# Altium footprint library klp.PcbLib: 436 footprints (part 12 of 28)
Each footprint in its own frame and in the unit in brackets; x right, y up, seen from the top. Pads: shape width x height; smd on the part's side, far side on the other; paste and mask are expansions set on the pad; w line width, h text height; cw(c..) or ccw(c..) is an arc to the next point about the centre after c.
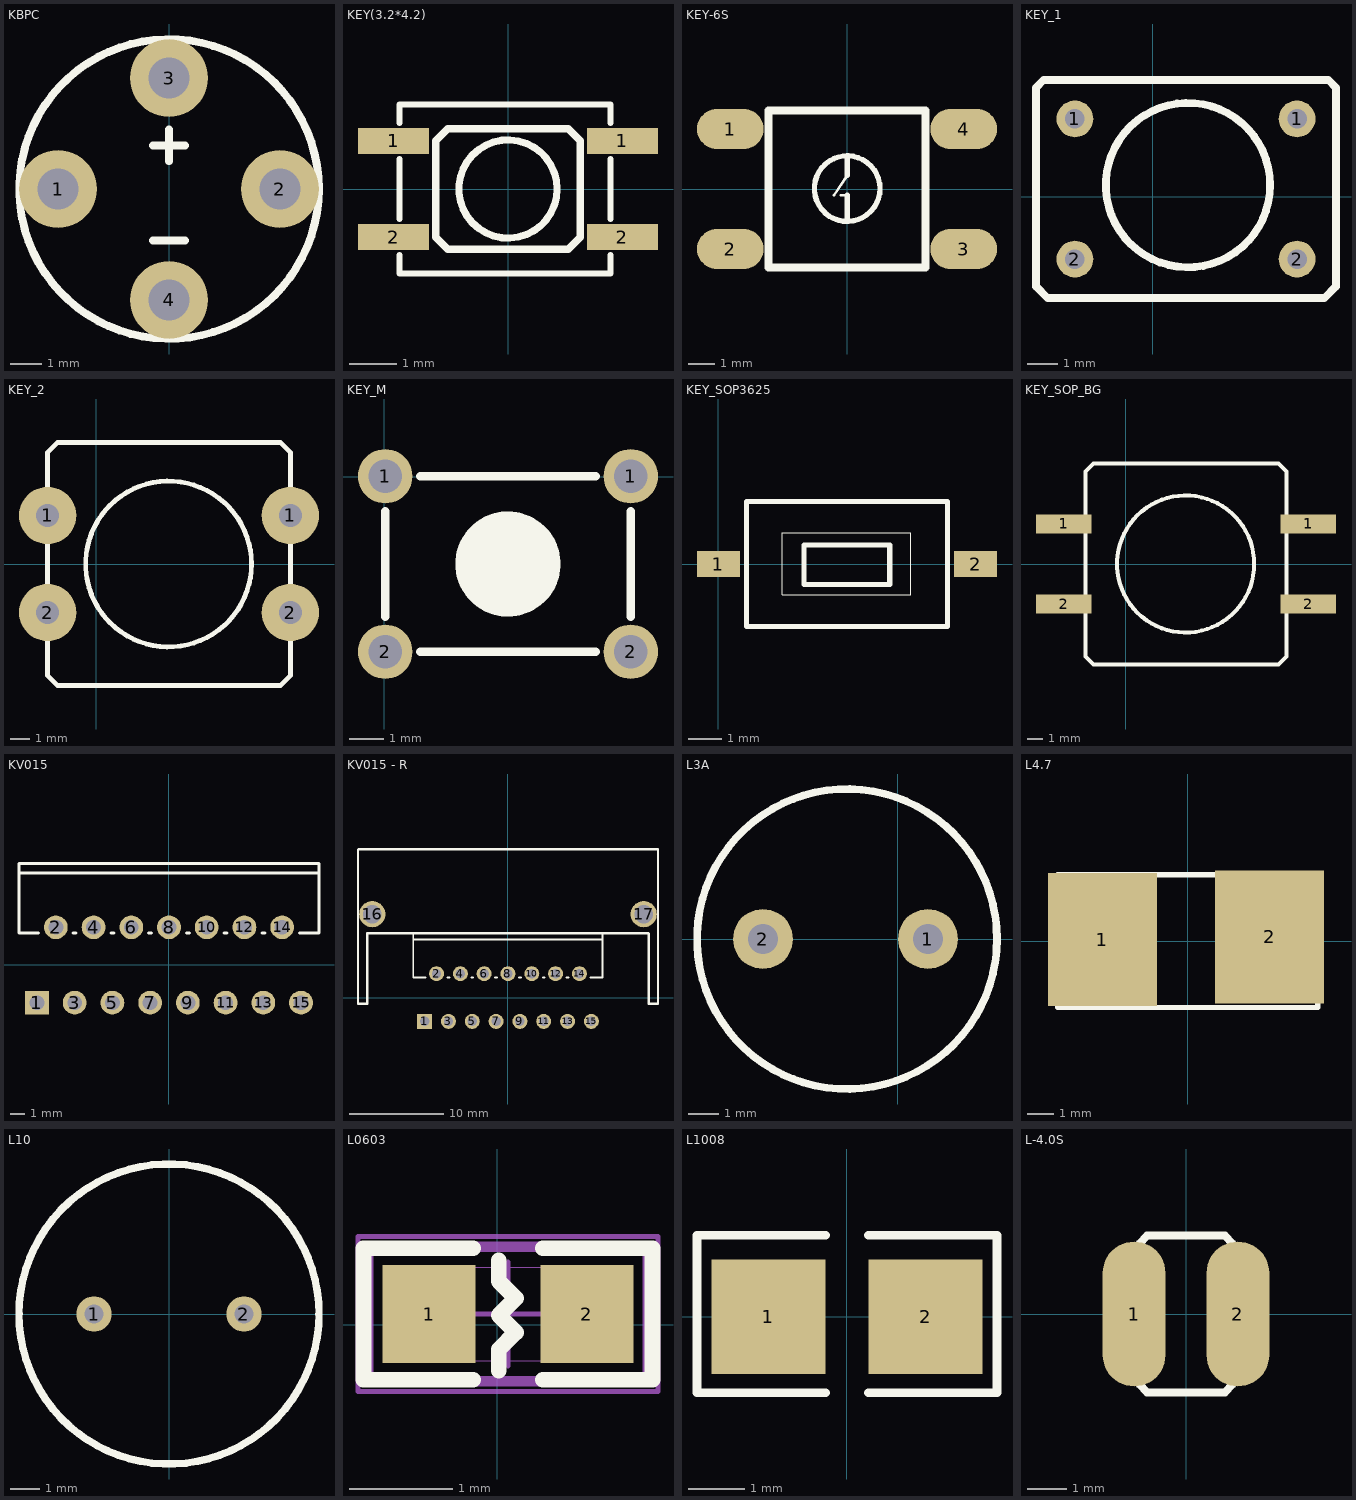
[diagram p11: the footprints below, top view; thin cyan lines are the x and y axes]

## KBPC [mm] "2W10"
height 5
pads (4):
  round 2.5 hole 1.3: 1(-3.556,12.7) 2(3.556,12.7) 3(0,16.256) 4(0,9.144)
Top Overlay:
  circle w0.254: c0,12.7 r4.8
  lines w0.254: -0.508,11.049 0.508,11.049 ; -0.508,14.097 0,14.097 0.508,14.097 ; 0,13.589 0,14.605

## KEY(3.2*4.2) [mm]
pads (4):
  rect 1.5x0.55 smd mask+0.076: 1(-2.413,1.016) 1(2.413,1.016) 2(-2.413,-1.016) 2(2.413,-1.016)
Top Overlay:
  circle w0.152: c0,0 r1.036
  lines w0.127: -2.286,-1.397 -2.286,-1.778 2.159,-1.778 2.159,-1.397 ; -2.286,-0.635 -2.286,0.635 ; -2.286,1.397 -2.286,1.778 -2.032,1.778 2.159,1.778 2.159,1.397 ; 2.159,-0.635 2.159,0.635
  lines w0.152: -1.524,-1.016 -1.27,-1.27 1.27,-1.27 1.524,-1.016 1.524,1.016 1.27,1.27 -1.27,1.27 -1.524,1.016 -1.524,-1.016

## KEY-6S [mil]
pads (4):
  oval 100x60 smd: 1(-175,90) 2(-175,-90) 3(175,-90) 4(175,90)
Top Overlay:
  circle w8: c0.27,0.61 r49.21
  lines w4: -19.42,-9.24 0.27,20.29 ; -9.57,-9.24 0.27,-9.24
  lines w8: 0.27,-48.61 0.27,-9.23 ; 0.27,20.29 0.27,49.82
  lines w12: -118.11,-118.11 -118.11,118.11 118.11,118.11 118.11,-118.11 -118.11,-118.11
3D body "10.stp": height 267.87, standoff 2.13, extent -200.64,-122.05 200.65,122.05

## KEY_1 [mm] "KEY?"
height 5
pads (4):
  round 1.2 hole 0.635: 1(-2.54,2.54) 1(4.699,2.54) 2(-2.54,-2.032) 2(4.699,-2.032)
Top Overlay:
  circle w0.254: c1.143,0.381 r2.679
  lines w0.254: -3.81,3.048 -3.81,3.556 -3.556,3.81 ; -3.81,3.302 -3.81,-2.921 -3.429,-3.302 5.588,-3.302 5.969,-2.921 5.969,3.556 5.715,3.81 -3.556,3.81 ; -2.921,3.81 -3.556,3.81

## KEY_2 [mm] "KEY?"
pads (4):
  round 3 hole 1.2: 1(-2.54,2.54) 1(10.16,2.54) 2(-2.54,-2.54) 2(10.16,-2.54)
Top Overlay:
  circle w0.254: c3.788,0 r4.34
  lines w0.254: 7.747,6.35 9.652,6.35 10.16,5.842 10.16,-5.842 9.652,-6.35 -2.032,-6.35 -2.54,-5.842 -2.54,5.842 -2.032,6.35 0.127,6.35 8.509,6.35

## KEY_M [mil] "KEY_MID"
pads (4):
  round 62 hole 38: 1(0.88,0.29) 1(280.85,0.29) 2(0.88,-199.71) 2(280.85,-199.71)
Top Overlay:
  circle w60: c140.85,-99.71 r30
  lines w10: 0.85,-159.71 0.85,-39.71 ; 40.85,-199.71 240.85,-199.71 ; 40.85,0.29 240.85,0.29 ; 280.85,-159.71 280.85,-39.71

## KEY_SOP3625 [mm]
pads (2):
  rect 1.3x0.8 smd: 1(0,0) 2(7.8,0)
Top Overlay:
  lines w0.025: 1.941,-0.938 5.827,-0.938 5.827,0.942 1.941,0.942 1.941,-0.938
  lines w0.152: 2.597,-0.623 2.597,0.577 ; 2.597,-0.623 5.197,-0.623 ; 2.597,-0.623 2.597,0.577 ; 2.597,-0.623 5.197,-0.623 ; 2.597,0.577 5.197,0.577 ; 2.597,0.577 5.197,0.577 ; 5.197,-0.623 5.197,0.577 ; 5.197,-0.623 5.197,0.577 ; 0.85,-1.9 6.95,-1.9 6.95,1.9 0.85,1.9 0.85,0 0.85,-1.9

## KEY_SOP_BG [mm] "KEY?"
height 5
pads (4):
  rect 3.5x1.2 smd: 1(-3.937,2.54) 1(11.557,2.54) 2(-3.937,-2.54) 2(11.557,-2.54)
Top Overlay:
  circle w0.254: c3.788,0 r4.34
  lines w0.254: 7.747,6.35 9.652,6.35 10.16,5.842 10.16,-5.842 9.652,-6.35 -2.032,-6.35 -2.54,-5.842 -2.54,5.842 -2.032,6.35 0.127,6.35 8.509,6.35

## KV015 [mm] "TO, Thru-Hole, Vertical, Heatsink Mounted; 15 Bent Staggered Leads; Pitch 1.27 mm"
height 21
pads (15):
  rect 1.6x1.6 hole 1: 1(-8.89,-2.54)
  round 1.6 hole 1: 2(-7.62,2.54) 3(-6.35,-2.54) 4(-5.08,2.54) 5(-3.81,-2.54) 6(-2.54,2.54) 7(-1.27,-2.54) 8(0,2.54) 9(1.27,-2.54) 10(2.54,2.54) 11(3.81,-2.54) 12(5.08,2.54) 13(6.35,-2.54) 14(7.62,2.54) 15(8.89,-2.54)
Top Overlay:
  lines w0.2: -10.1,6.19 10.1,6.19 ; -8.8,2.14 -10.1,2.14 -10.1,6.84 10.1,6.84 10.1,2.14 8.8,2.14 ; -6.45,2.14 -6.25,2.14 ; -3.91,2.14 -3.71,2.14 ; -1.37,2.14 -1.17,2.14 ; 1.17,2.14 1.37,2.14 ; 3.71,2.14 3.91,2.14 ; 6.25,2.14 6.45,2.14

## KV015 - R [mm] "TO, Thru-Hole, Vertical, Heatsink Mounted; 15 Bent Staggered Leads; Pitch 1.27 mm"
height 21
pads (17):
  rect 1.6x1.6 hole 1: 1(-8.89,-2.54)
  round 1.6 hole 1: 2(-7.62,2.54) 3(-6.35,-2.54) 4(-5.08,2.54) 5(-3.81,-2.54) 6(-2.54,2.54) 7(-1.27,-2.54) 8(0,2.54) 9(1.27,-2.54) 10(2.54,2.54) 11(3.81,-2.54) 12(5.08,2.54) 13(6.35,-2.54) 14(7.62,2.54) 15(8.89,-2.54)
  round 2.8 hole 2: 16(-14.478,8.89) 17(14.478,8.89)
Top Overlay:
  lines w0.2: -10.1,6.19 10.1,6.19 ; -8.8,2.14 -10.1,2.14 -10.1,6.84 10.1,6.84 10.1,2.14 8.8,2.14 ; -6.45,2.14 -6.25,2.14 ; -3.91,2.14 -3.71,2.14 ; -1.37,2.14 -1.17,2.14 ; 1.17,2.14 1.37,2.14 ; 3.71,2.14 3.91,2.14 ; 6.25,2.14 6.45,2.14
  lines w0.254: -16,15.779 -16,10.16 -16,6.84 -16,-0.66 -15,-0.66 -15,6.858 14.968,6.858 15.002,6.824 15.002,-0.66 16.002,-0.66 16.002,6.84 ; -15.953,15.826 -15.826,15.826 16.002,15.826 16.002,6.604

## L3A [mm] "10*13"
height 13
pads (2):
  round 2 hole 1: 1(1,0) 2(-4.5,0)
Top Overlay:
  circle w0.254: c-1.7,0 r5

## L4.7 [mm]
pads (2):
  rect 4.1x5 smd: 1(-3.216,0.054) 2(3.084,0.154)
Top Overlay:
  lines w0.2: -4.9,-2.5 4.9,-2.5 4.9,2.5 -4.9,2.5 -4.9,0 -4.9,-2.5

## L10 [mm] "10mH"
height 15
pads (2):
  round 1.2 hole 0.635: 1(-2.54,0) 2(2.54,0)
Top Overlay:
  circle w0.254: c0,0 r5.08

## L0603 [mm]
pads (2):
  rect 0.9x0.95 smd: 1(-0.66,0.102) 2(0.864,0.102)
Top Overlay:
  lines w0.152: -0.235,-0.533 -1.295,-0.533 -1.295,0.737 -0.235,0.737 ; 0.013,-0.445 0.013,-0.241 0.178,-0.076 0.013,0.089 0.178,0.254 0.013,0.419 0.013,0.622 ; 0.438,-0.533 1.499,-0.533 1.499,0.737 0.438,0.737
Mechanical 15:
  lines w0.1: -1.248,-0.548 1.452,-0.548 1.452,0.752 -1.248,0.752 -1.248,-0.548
  text "1" at -0.024,-0.243 h0.58
Mechanical 16:
  lines w0.001: -0.748,-0.348 0.952,-0.348 0.952,0.552 -0.748,0.552 -0.748,-0.348
  lines w0.05: -0.398,0.102 0.602,0.102 ; 0.102,-0.398 0.102,0.602 ; -1.348,-0.648 1.552,-0.648 1.552,0.852 -1.348,0.852 -1.348,-0.648
3D body "User Library-0603 SMD Resistor.STEP": height 0.3, standoff 0, extent -0.698,-0.298 0.902,0.502

## L1008 [mil]
pads (2):
  rrect0% 80x80 smd: 1(-55,0) 2(55,0)
Top Overlay:
  lines w6: -15,-53 -105,-53 -105,57 -15,57 ; 15,-53 105,-53 105,57 15,57
3D body "User Library-INDM2520X190N.step": height 70.87, standoff 0, extent -54.14,-39.37 44.29,39.36

## L-4.0S [mm]
pads (2):
  oval 1.6x3.7 smd: 1(-1.325,0) 2(1.325,0)
Top Overlay:
  lines w0.203: -1,-2 cw(c1,0) -1,2 1,2 cw(c-1,0) 1,-2 -1,-2